# Altium footprint library North POLE.PcbLib: 419 footprints (part 13 of 27)
Each footprint in its own frame and in the unit in brackets; x right, y up, seen from the top. Pads: shape width x height; smd on the part's side, far side on the other; paste and mask are expansions set on the pad; w line width, h text height; cw(c..) or ccw(c..) is an arc to the next point about the centre after c.
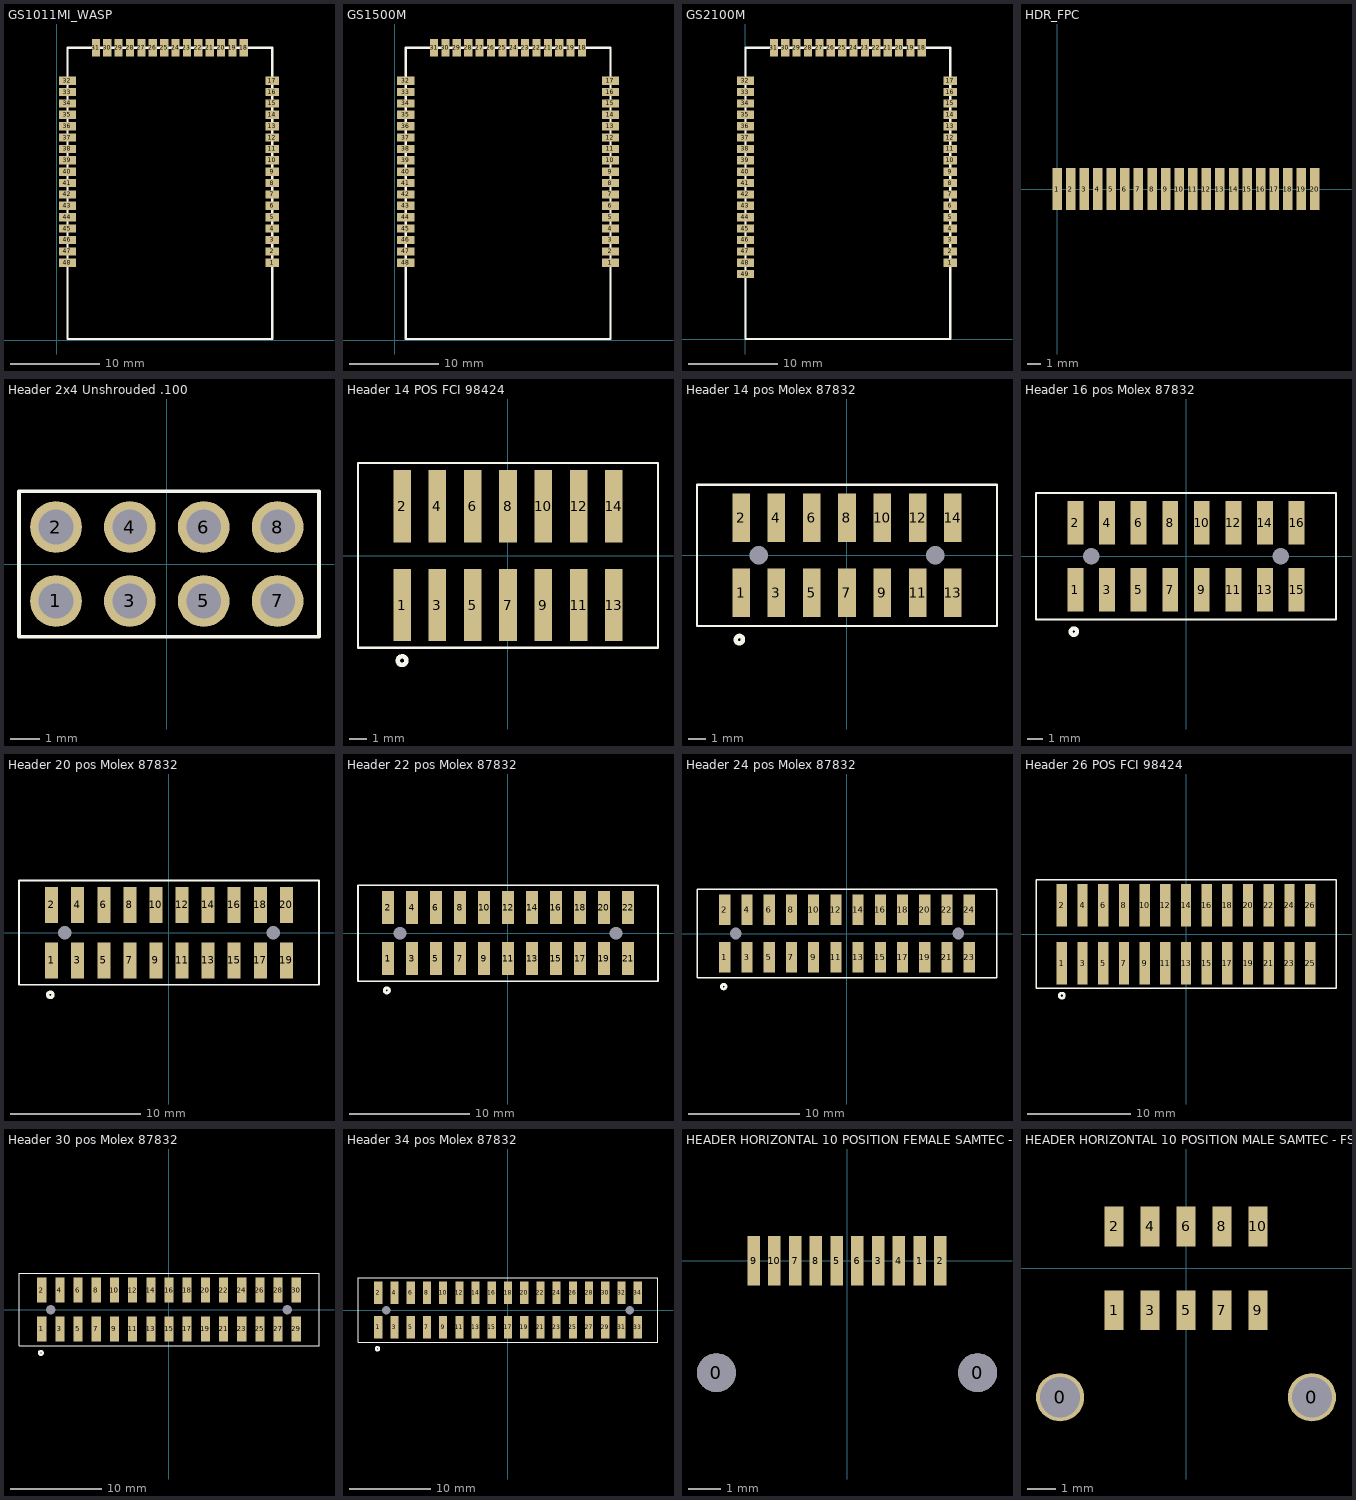
[diagram p12: the footprints below, top view; thin cyan lines are the x and y axes]

## GS1011MI_WASP [mil]
pads (48):
  rect 61x36 smd paste+0 mask+0: 1(948,340) 2(948,390) 3(948,440) 4(948,490) 5(948,540) 6(948,590) 7(948,640) 8(948,690) 9(948,740) 10(948,790) 11(948,840) 12(948,890) 13(948,940) 14(948,990) 15(948,1040) 16(948,1090) 17(948,1140)
  rect 36x76 smd paste+0 mask+0: 18(823,1285) 19(773,1285) 20(723,1285) 21(673,1285) 22(623,1285) 23(573,1285) 24(523,1285) 25(473,1285) 26(423,1285) 27(373,1285) 28(323,1285) 29(273,1285) 30(223,1285) 31(173,1285)
  rect 76x36 smd paste+0 mask+0: 32(48,1140) 33(48,1090) 34(48,1040) 35(48,990) 36(48,940) 37(48,890) 38(48,840) 39(48,790) 40(48,740) 41(48,690) 42(48,640) 43(48,590) 44(48,540) 45(48,490) 46(48,440) 47(48,390) 48(48,340)
Top Overlay:
  lines w10: 48,5 48,1285 948,1285 948,5 48,5

## GS1500M [mil]
pads (48):
  rect 75x36 smd paste+0 mask+0: 1(948,340) 2(948,390) 3(948,440) 4(948,490) 5(948,540) 6(948,590) 7(948,640) 8(948,690) 9(948,740) 10(948,790) 11(948,840) 12(948,890) 13(948,940) 14(948,990) 15(948,1040) 16(948,1090) 17(948,1140)
  rect 36x76 smd paste+0 mask+0: 18(823,1285) 19(773,1285) 20(723,1285) 21(673,1285) 22(623,1285) 23(573,1285) 24(523,1285) 25(473,1285) 26(423,1285) 27(373,1285) 28(323,1285) 29(273,1285) 30(223,1285) 31(173,1285)
  rect 76x36 smd paste+0 mask+0: 32(48,1140) 33(48,1090) 34(48,1040) 35(48,990) 36(48,940) 37(48,890) 38(48,840) 39(48,790) 40(48,740) 41(48,690) 42(48,640) 43(48,590) 44(48,540) 45(48,490) 46(48,440) 47(48,390) 48(48,340)
Top Overlay:
  lines w10: 48,5 48,1285 948,1285 948,5 48,5

## GS2100M [mil] "Gainspan GS2100M 2.4 Ghz module"
pads (49):
  rect 61x36 smd paste+0 mask+0: 1(900,335) 2(900,385) 3(900,435) 4(900,485) 5(900,535) 6(900,585) 7(900,635) 8(900,685) 9(900,735) 10(900,785) 11(900,835) 12(900,885) 13(900,935) 14(900,985) 15(900,1035) 16(900,1085) 17(900,1135)
  rect 36x76 smd paste+0 mask+0: 18(775,1280) 19(725,1280) 20(675,1280) 21(625,1280) 22(575,1280) 23(525,1280) 24(475,1280) 25(425,1280) 26(375,1280) 27(325,1280) 28(275,1280) 29(225,1280) 30(175,1280) 31(125,1280)
  rect 76x36 smd paste+0 mask+0: 32(0,1135) 33(0,1085) 34(0,1035) 35(0,985) 36(0,935) 37(0,885) 38(0,835) 39(0,785) 40(0,735) 41(0,685) 42(0,635) 43(0,585) 44(0,535) 45(0,485) 46(0,435) 47(0,385) 48(0,335) 49(0,285)
Top Overlay:
  lines w10: 0,0 900,0 900,1280 0,1280 0,0

## HDR_FPC [mm] "20 pin header for fpc"
pads (20):
  rect 0.7x3.1 smd: 1(0,0) 2(1,0) 3(2,0) 4(3,0) 5(4,0) 6(5,0) 7(6,0) 8(7,0) 9(8,0) 10(9,0) 11(10,0) 12(11,0) 13(12,0) 14(13,0) 15(14,0) 16(15,0) 17(16,0) 18(17,0) 19(18,0) 20(19,0)

## Header 2x4 Unshrouded .100 [mil]
pads (8):
  round 70 hole 47: 1(-150,-50) 2(-150,50) 3(-50,-50) 4(-50,50) 5(50,-50) 6(50,50) 7(150,-50) 8(150,50)
Top Overlay:
  lines w5: -200,-98.43 -200,98.43 206,98.43 206,-98.43 -200,-98.43
3D body: height 348.35, standoff -116.22, extent -199.99,-98.42 200.01,98.43

## Header 14 POS FCI 98424 [mm]
pads (14):
  rect 1x4.1 smd: 1(-6,-2.8) 2(-6,2.8) 3(-4,-2.8) 4(-4,2.8) 5(-2,-2.8) 6(-2,2.8) 7(0,-2.8) 8(0,2.8) 9(2,-2.8) 10(2,2.8) 11(4,-2.8) 12(4,2.8) 13(6,-2.8) 14(6,2.8)
Top Overlay:
  circle w0.254: c-6,-5.95 r0.246
  lines w0.127: -8.5,-5.225 8.5,-5.225 8.5,5.25 -5.925,5.25 -8.5,5.25 -8.5,-5.225
3D body: height 6.45, standoff 0, extent -7.95,-4.525 8.05,4.475

## Header 14 pos Molex 87832 [mm]
pads (16):
  rect 1x2.75 smd: 1(-6,-2.125) 2(-6,2.125) 3(-4,-2.125) 4(-4,2.125) 5(-2,-2.125) 6(-2,2.125) 7(0,-2.125) 8(0,2.125) 9(2,-2.125) 10(2,2.125) 11(4,-2.125) 12(4,2.125) 13(6,-2.125) 14(6,2.125)
  rect 0x0 hole 1.05 unplated: 4(-5,0) 4(5,0)
Top Overlay:
  circle w0.254: c-6.1,-4.775 r0.206
  lines w0.127: -8.5,-4 -8.5,4 -5.175,4 8.5,4 8.5,-4 -8.5,-4
3D body: height 9.05, standoff 0, extent -8.35,-3.15 8.3,3.2

## Header 16 pos Molex 87832 [mm]
pads (18):
  rect 1x2.75 smd: 1(-7,-2.125) 2(-7,2.125) 3(-5,-2.125) 4(-5,2.125) 5(-3,-2.125) 6(-3,2.125) 7(-1,-2.125) 8(-1,2.125) 9(1,-2.125) 10(1,2.125) 11(3,-2.125) 12(3,2.125) 13(5,-2.125) 14(5,2.125) 15(7,-2.125) 16(7,2.125)
  rect 0x0 hole 1.05 unplated: 4(-6,0) 4(6,0)
Top Overlay:
  circle w0.254: c-7.1,-4.775 r0.206
  lines w0.127: -9.5,-4 -9.5,4 -6.175,4 9.5,4 9.5,-4 -9.5,-4
3D body: height 9.05, standoff 0, extent -9.325,-3.025 9.325,3.325

## Header 20 pos Molex 87832 [mm]
pads (22):
  rect 1x2.75 smd: 1(-9,-2.125) 2(-9,2.125) 3(-7,-2.125) 4(-7,2.125) 5(-5,-2.125) 6(-5,2.125) 7(-3,-2.125) 8(-3,2.125) 9(-1,-2.125) 10(-1,2.125) 11(1,-2.125) 12(1,2.125) 13(3,-2.125) 14(3,2.125) 15(5,-2.125) 16(5,2.125) 17(7,-2.125) 18(7,2.125) 19(9,-2.125) 20(9,2.125)
  rect 0x0 hole 1.05 unplated: 4(-8,0) 4(8,0)
Top Overlay:
  circle w0.254: c-9.1,-4.775 r0.206
  lines w0.127: -11.5,-4 11.5,-4 11.5,4 -8.175,4 -11.5,4 -11.5,-4
3D body: height 9.05, standoff 0, extent -11.325,-3.125 11.325,3.225

## Header 22 pos Molex 87832 [mm]
pads (24):
  rect 1x2.75 smd: 1(-10,-2.125) 2(-10,2.125) 3(-8,-2.125) 4(-8,2.125) 5(-6,-2.125) 6(-6,2.125) 7(-4,-2.125) 8(-4,2.125) 9(-2,-2.125) 10(-2,2.125) 11(0,-2.125) 12(0,2.125) 13(2,-2.125) 14(2,2.125) 15(4,-2.125) 16(4,2.125) 17(6,-2.125) 18(6,2.125) 19(8,-2.125) 20(8,2.125) 21(10,-2.125) 22(10,2.125)
  rect 0x0 hole 1.05 unplated: 4(-9,0) 4(9,0)
Top Overlay:
  circle w0.254: c-10.1,-4.775 r0.206
  lines w0.127: -12.5,-4 -12.5,4 -9.175,4 12.5,4 12.5,-4 -12.5,-4
3D body: height 7.6, standoff -0.75, extent -12.325,-3.225 12.325,3.075

## Header 24 pos Molex 87832 [mm]
pads (26):
  rect 1x2.75 smd: 1(-11,-2.125) 2(-11,2.125) 3(-9,-2.125) 4(-9,2.125) 5(-7,-2.125) 6(-7,2.125) 7(-5,-2.125) 8(-5,2.125) 9(-3,-2.125) 10(-3,2.125) 11(-1,-2.125) 12(-1,2.125) 13(1,-2.125) 14(1,2.125) 15(3,-2.125) 16(3,2.125) 17(5,-2.125) 18(5,2.125) 19(7,-2.125) 20(7,2.125) 21(9,-2.125) 22(9,2.125) 23(11,-2.125) 24(11,2.125)
  rect 0x0 hole 1.05 unplated: 4(-10,0) 4(10,0)
Top Overlay:
  circle w0.254: c-11.1,-4.775 r0.206
  lines w0.127: -13.5,-4 -13.5,4 -10.175,4 13.5,4 13.5,-4 -13.5,-4
3D body: height 7.6, standoff -0.75, extent -13.325,-3.15 13.325,3.15

## Header 26 POS FCI 98424 [mm]
pads (26):
  rect 1x4.1 smd: 1(-12,-2.8) 2(-12,2.8) 3(-10,-2.8) 4(-10,2.8) 5(-8,-2.8) 6(-8,2.8) 7(-6,-2.8) 8(-6,2.8) 9(-4,-2.8) 10(-4,2.8) 11(-2,-2.8) 12(-2,2.8) 13(0,-2.8) 14(0,2.8) 15(2,-2.8) 16(2,2.8) 17(4,-2.8) 18(4,2.8) 19(6,-2.8) 20(6,2.8) 21(8,-2.8) 22(8,2.8) 23(10,-2.8) 24(10,2.8) 25(12,-2.8) 26(12,2.8)
Top Overlay:
  circle w0.254: c-12,-5.95 r0.246
  lines w0.127: -14.5,-5.225 14.5,-5.225 14.5,5.25 -11.925,5.25 -14.5,5.25 -14.5,-5.225
3D body: height 6.45, standoff 0, extent -14,-4.475 14,4.525

## Header 30 pos Molex 87832 [mm]
pads (32):
  rect 1x2.75 smd: 1(-14,-2.125) 2(-14,2.125) 3(-12,-2.125) 4(-12,2.125) 5(-10,-2.125) 6(-10,2.125) 7(-8,-2.125) 8(-8,2.125) 9(-6,-2.125) 10(-6,2.125) 11(-4,-2.125) 12(-4,2.125) 13(-2,-2.125) 14(-2,2.125) 15(0,-2.125) 16(0,2.125) 17(2,-2.125) 18(2,2.125) 19(4,-2.125) 20(4,2.125) 21(6,-2.125) 22(6,2.125) 23(8,-2.125) 24(8,2.125) 25(10,-2.125) 26(10,2.125) 27(12,-2.125) 28(12,2.125) 29(14,-2.125) 30(14,2.125)
  rect 0x0 hole 1.05 unplated: 4(-13,0) 4(13,0)
Top Overlay:
  circle w0.254: c-14.1,-4.775 r0.206
  lines w0.127: -16.5,-4 -16.5,4 -13.175,4 16.5,4 16.5,-4 -16.5,-4
3D body: height 9.05, standoff 0, extent -16.325,-3.175 16.325,3.175

## Header 34 pos Molex 87832 [mm]
pads (36):
  rect 1x2.75 smd: 1(-16,-2.125) 2(-16,2.125) 3(-14,-2.125) 4(-14,2.125) 5(-12,-2.125) 6(-12,2.125) 7(-10,-2.125) 8(-10,2.125) 9(-8,-2.125) 10(-8,2.125) 11(-6,-2.125) 12(-6,2.125) 13(-4,-2.125) 14(-4,2.125) 15(-2,-2.125) 16(-2,2.125) 17(0,-2.125) 18(0,2.125) 19(2,-2.125) 20(2,2.125) 21(4,-2.125) 22(4,2.125) 23(6,-2.125) 24(6,2.125) 25(8,-2.125) 26(8,2.125) 27(10,-2.125) 28(10,2.125) 29(12,-2.125) 30(12,2.125) 31(14,-2.125) 32(14,2.125) 33(16,-2.125) 34(16,2.125)
  rect 0x0 hole 1.05 unplated: 4(-15,0) 4(15,0)
Top Overlay:
  circle w0.254: c-16.1,-4.775 r0.206
  lines w0.127: -18.5,-4 18.5,-4 18.5,4 -15.175,4 -18.5,4 -18.5,-4
3D body: height 9.05, standoff 0, extent -18.325,-3.175 18.325,3.175

## HEADER HORIZONTAL 10 POSITION FEMALE SAMTEC - SFMH-105-02-L-D-LC [mm]
pads (12):
  round 1.19 hole 1.19 unplated: 0(-4,-3.43) 0(4,-3.43)
  rect 0.38x1.52 smd: 1(2.222,0) 2(2.857,0) 3(0.953,0) 4(1.587,0) 5(-0.318,0) 6(0.318,0) 7(-1.587,0) 8(-0.953,0) 9(-2.857,0) 10(-2.222,0)
3D body: height 3.41, standoff -0.01, extent -4.61,-5.74 4.661,0.483

## HEADER HORIZONTAL 10 POSITION MALE SAMTEC - FSH-105-04-F-DH-SL [mm]
pads (12):
  round 1.702 hole 1.42: 0(-4.445,-4.553) 0(4.445,-4.553)
  rect 0.66x1.4 smd: 1(-2.54,-1.48) 2(-2.54,1.48) 3(-1.27,-1.48) 4(-1.27,1.48) 5(0,-1.48) 6(0,1.48) 7(1.27,-1.48) 8(1.27,1.48) 9(2.54,-1.48) 10(2.54,1.48)
3D body: height 3.92, standoff -1.28, extent -5.715,-10.025 5.715,2.397